# Altium footprint library GyokuRe.PcbLib: 1248 footprints (part 5 of 78)
Each footprint in its own frame and in the unit in brackets; x right, y up, seen from the top. Pads: shape width x height; smd on the part's side, far side on the other; paste and mask are expansions set on the pad; w line width, h text height; cw(c..) or ccw(c..) is an arc to the next point about the centre after c.
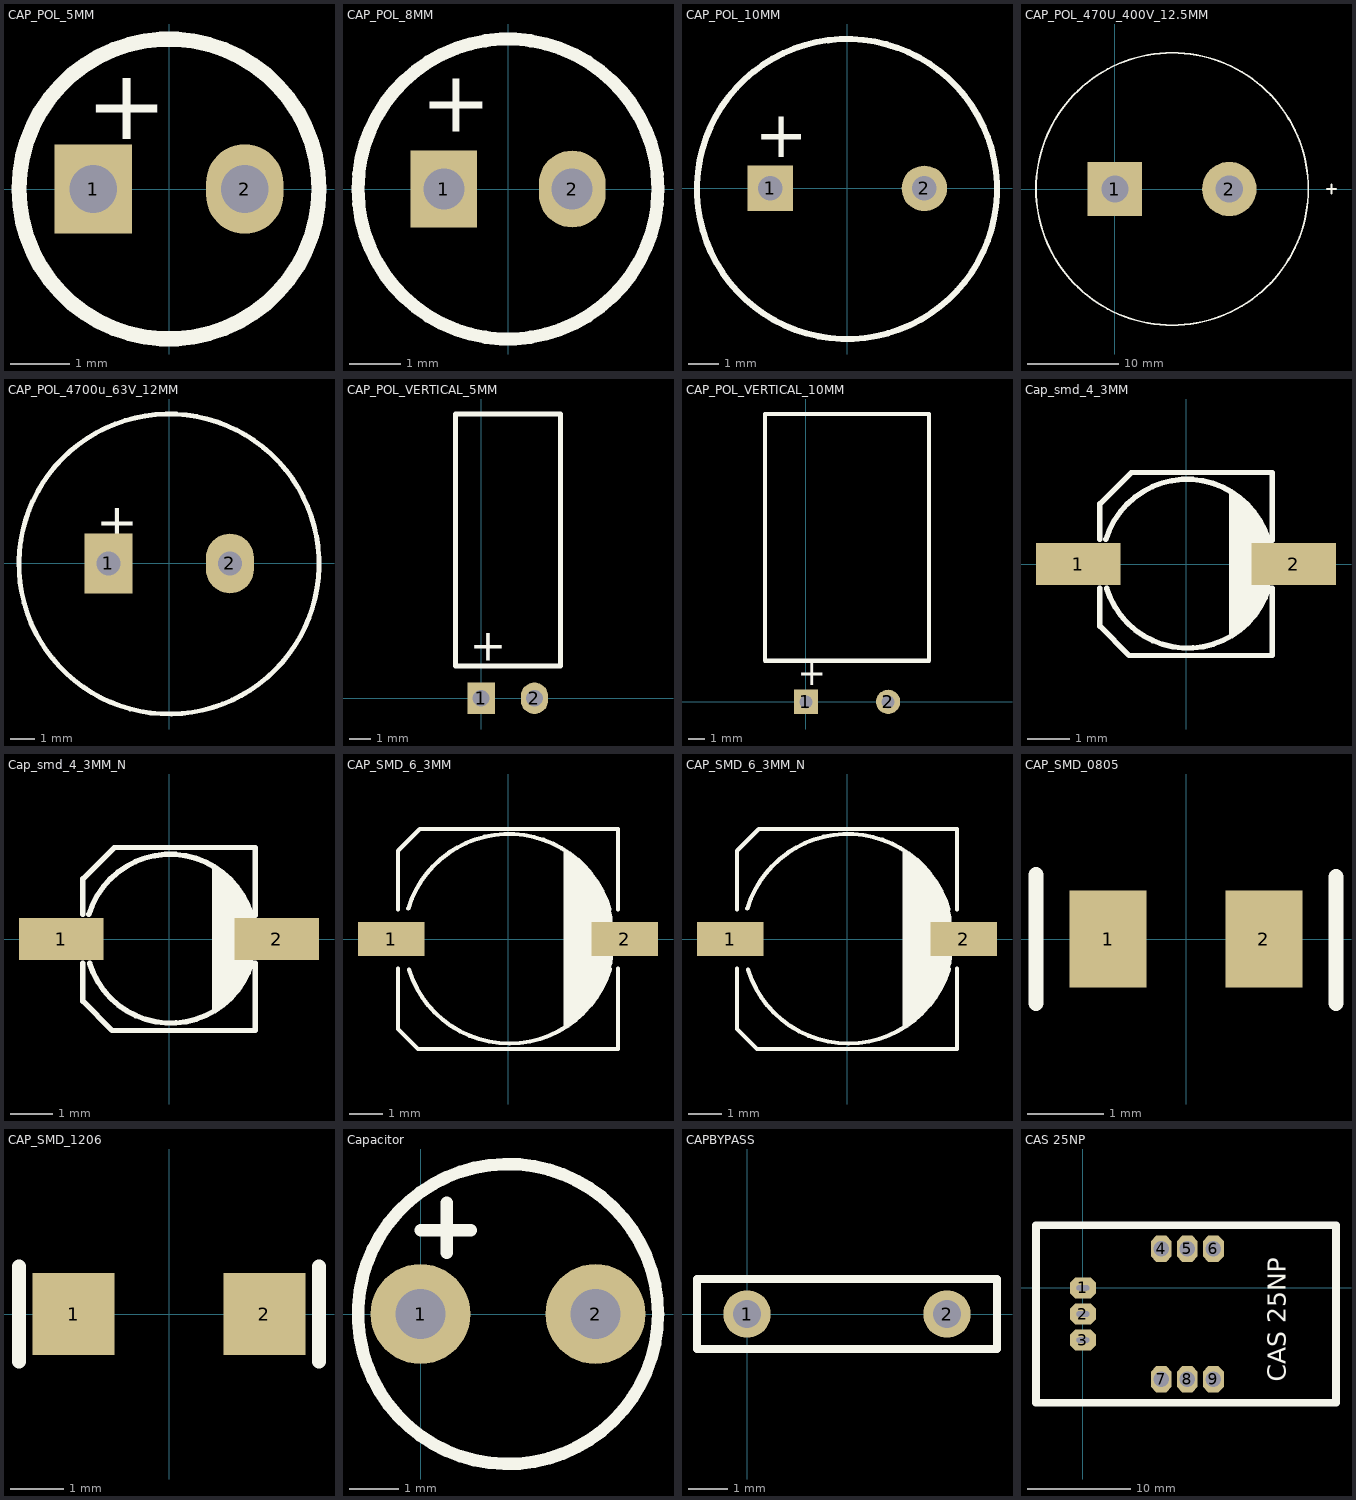
[diagram p4: the footprints below, top view; thin cyan lines are the x and y axes]

## CAP_POL_5MM [mm]
pads (2):
  rect 1.3x1.5 hole 0.8: 1(-1.27,0)
  oval 1.3x1.5 hole 0.8: 2(1.27,0)
Top Overlay:
  circle w0.254: c0,0 r2.515
  text "+" at -1.397,0.838 h1.2
3D body "User Library-Capacitor Radial Electrolitic 200 - 500x1100.step": height 11.01, standoff -2.7, extent -2.5,-2.5 2.489,2.5

## CAP_POL_8MM [mm]
pads (2):
  rect 1.3x1.5 hole 0.8: 1(-1.25,0)
  oval 1.3x1.5 hole 0.8: 2(1.25,0)
Top Overlay:
  circle w0.254: c0,0 r2.921
  text "+" at -1.702,1.118 h1.2
3D body "User Library-Capacitor Radial Electrolitic 250-630x1150.step": height 11.51, standoff -2.7, extent -3.15,-3.15 3.133,3.15

## CAP_POL_10MM [mm]
pads (2):
  rect 1.5x1.5 hole 0.8: 1(-2.54,0)
  round 1.5 hole 0.8: 2(2.54,0)
Top Overlay:
  lines w0.203: 3.591,3.365 ccw(c-0.008,-0.022) 3.623,3.33
  text "+" at -3.048,1.016 h1.52
3D body "User Library-Capacitor Radial Electrolitic 500-1000x2000.step": height 20.01, standoff -2.7, extent -5,-5 4.967,5

## CAP_POL_470U_400V_12.5MM [mm]
pads (2):
  rect 6x6 hole 3: 1(0,0)
  round 6 hole 3: 2(12.6,0)
Top Overlay:
  circle w0.2: c6.3,0 r15
  lines w0.2: 23.332,0 24.348,0 ; 23.84,-0.508 23.84,0.508
3D body "User Library-Snap-in 35X45-P10.step": height 46, standoff -3.62, extent -11.557,-18.034 24.003,17.526

## CAP_POL_4700u_63V_12MM [mm]
pads (2):
  rect 2x2.5 hole 1: 1(-2.54,0)
  oval 2x2.5 hole 1: 2(2.54,0)
Top Overlay:
  lines w0.203: 4.556,4.273 ccw(c-0.008,-0.022) 4.597,4.228
  text "+" at -3.048,1.016 h1.52
3D body "User Library-Capacitor Radial Electrolitic 500-1250x2500.step": height 2.2, standoff -25.51, extent -6.25,-6.25 6.207,6.25

## CAP_POL_VERTICAL_5MM [mm]
pads (2):
  rect 1.3x1.5 hole 0.8: 1(0,0)
  oval 1.3x1.5 hole 0.8: 2(2.54,0)
Top Overlay:
  lines w0.254: -1.219,1.537 3.781,1.537 3.781,13.537 -1.219,13.537 -1.219,1.537
  text "+" at -0.533,1.791 h1.52

## CAP_POL_VERTICAL_10MM [mm]
pads (2):
  rect 1.5x1.5 hole 0.8: 1(0,0)
  round 1.5 hole 0.8: 2(5.08,0)
Top Overlay:
  lines w0.254: -2.527,2.54 -2.527,17.793 7.607,17.793 7.607,2.54 -2.527,2.54
  text "+" at -0.508,1.016 h1.52

## Cap_smd_4_3MM [mm] "10uF SMD"
pads (2):
  rect 2x1 smd: 1(-2.54,0) 2(2.54,0)
Top Overlay:
  region: 1.025,1.778 1.279,1.524 1.533,1.397 1.787,0.889 2.041,0.508 2.041,-0.381 1.787,-1.016 1.025,-1.778
  lines w0.127: -2.032,-0.575 -2.032,-1.468 -1.341,-2.159 2.032,-2.159 2.032,-0.565 ; -2.032,0.581 -2.032,1.418 -1.291,2.159 2.032,2.159 2.032,0.564 ; -1.889,0.581 cw(c0.024,0) 1.943,0.564 ; -1.872,-0.575 ccw(c0.039,0.015) 1.952,-0.565
3D body: height 1, standoff 0.1, extent -2.032,-2.159 2.041,2.088
3D body: height 4.51, standoff 4.5, extent 1.025,-1.7 1.925,1.725
3D body: height 4.5, standoff 1, extent -1.9,-2 1.875,1.975
3D body: height 1, standoff 0.1, extent -2.7,-0.45 -1.6,0.45
3D body: height 1, standoff 0.1, extent 1.625,-0.425 2.725,0.475

## Cap_smd_4_3MM_N [mm] "10uF SMD"
pads (2):
  rect 2x1 smd: 1(-2.54,0) 2(2.54,0)
Top Overlay:
  region: 1.025,1.778 1.279,1.524 1.533,1.397 1.787,0.889 2.041,0.508 2.041,-0.381 1.787,-1.016 1.025,-1.778
  lines w0.127: -2.032,-0.575 -2.032,-1.468 -1.341,-2.159 2.032,-2.159 2.032,-0.565 ; -2.032,0.581 -2.032,1.418 -1.291,2.159 2.032,2.159 2.032,0.564 ; -1.889,0.581 cw(c0.024,0) 1.943,0.564 ; -1.872,-0.575 ccw(c0.039,0.015) 1.952,-0.565
3D body "capacitor size B.STEP": height 5.41, standoff -0.01, extent -2.249,-2.166 2.351,2.134

## CAP_SMD_6_3MM [mm] "47uF 25V"
pads (2):
  rect 2x1.016 smd: 1(-3.5,0) 2(3.5,0)
Top Overlay:
  region: 3.15,-0.55 3.125,-0.725 3.05,-0.925 2.9,-1.325 2.725,-1.675 2.525,-1.95 1.9,-2.55 1.675,-2.675 1.675,2.675 2.15,2.35 2.475,1.975 2.775,1.525 3.05,0.975 3.125,0.65 3.15,0.375
  lines w0.127: -3.302,-0.889 -3.302,-2.698 -2.698,-3.302 3.302,-3.302 3.302,-0.889 ; -3.302,0.889 -3.302,2.648 -2.648,3.302 3.302,3.302 3.302,0.889 ; -2.991,0.915 cw(c0.024,0) 3.047,0.889 ; -2.972,-0.914 ccw(c0.039,0.015) 3.053,-0.899
3D body: height 5.5, standoff 1, extent -2.987,-3.112 2.989,2.876
3D body: height 5.52, standoff 5.5, extent 1.7,-2.65 3.15,2.65
3D body: height 1, standoff 0.1, extent 2.646,-0.45 3.746,0.45
3D body: height 1, standoff 0.1, extent -3.788,-0.451 -2.688,0.449
3D body: height 1, standoff 0.1, extent -3.25,-3.25 3.225,3.25

## CAP_SMD_6_3MM_N [mm] "47uF 25V"
pads (2):
  rect 2x1.016 smd: 1(-3.5,0) 2(3.5,0)
Top Overlay:
  region: 3.15,-0.55 3.125,-0.725 3.05,-0.925 2.9,-1.325 2.725,-1.675 2.525,-1.95 1.9,-2.55 1.675,-2.675 1.675,2.675 2.15,2.35 2.475,1.975 2.775,1.525 3.05,0.975 3.125,0.65 3.15,0.375
  lines w0.127: -3.302,-0.889 -3.302,-2.698 -2.698,-3.302 3.302,-3.302 3.302,-0.889 ; -3.302,0.889 -3.302,2.648 -2.648,3.302 3.302,3.302 3.302,0.889 ; -2.991,0.915 cw(c0.024,0) 3.047,0.889 ; -2.972,-0.914 ccw(c0.039,0.015) 3.053,-0.899
3D body "Capacitor size D.STEP": height 5.41, standoff -0.01, extent -3.551,-3.302 3.449,3.298

## CAP_SMD_0805 [mm] "Chip Resistor; Body 2.0 x 1.3 mm (LxW typ)"
height 2.54
pads (2):
  rect 1x1.27 smd: 1(-1.016,0) 2(1.016,0)
Top Overlay:
  lines w0.2: -1.956,-0.838 -1.956,0.838 ; 1.956,-0.838 1.956,0.813
3D body "User Library-0805 SMD Capacitor.step": height 0.78, standoff 0, extent -1,-0.625 1,0.625

## CAP_SMD_1206 [mil]
pads (2):
  rect 60x60 smd: 1(-70,0) 2(70,0)
Top Overlay:
  lines w10: -110,-35 -110,35 ; 110,-35 110,35
3D body "User Library-1206 SMD Capacitor.step": height 39.45, standoff 0, extent -62.99,-31.49 63,31.5
3D body: height 40, standoff 0, extent -35,-35 35,35

## Capacitor [mil]
pads (2):
  round 80 hole 40: 1(0,0) 2(140,0)
Top Overlay:
  circle w10: c70,0 r120
  lines w10: 0,67 40,67 ; 21,49 21,89
3D body "SW3dPS-224-0025.STEP": height 690.55, standoff -569.29, extent -86.47,-158.48 228.49,156.48

## CAPBYPASS [mm] "Cap 300x50 - 200"
pads (2):
  round 1.2 hole 0.7: 1(0,0) 2(5.08,0)
Top Overlay:
  lines w0.2: -1.27,-0.889 -1.27,0.889 6.35,0.889 6.35,-0.889 -1.27,-0.889

## CAS 25NP [mil] "Current Sensor LEM"
pads (9):
  oct 100x80 hole 20 slot 50 at 0 deg: 1(0,0) 2(0,-100) 3(0,-200)
  oct 80x100 hole 60: 4(300,150) 5(400,150) 6(500,150) 7(300,-350) 8(400,-350) 9(500,-350)
Top Overlay:
  lines w30: -180,-440 970,-440 970,240 -130,240 -180,240 -180,-440
  text "CAS 25NP" at 800,-360 h120